# Altium footprint library ACTION_IC封装.PcbLib: 114 footprints (part 1 of 8)
Each footprint in its own frame and in the unit in brackets; x right, y up, seen from the top. Pads: shape width x height; smd on the part's side, far side on the other; paste and mask are expansions set on the pad; w line width, h text height; cw(c..) or ccw(c..) is an arc to the next point about the centre after c.
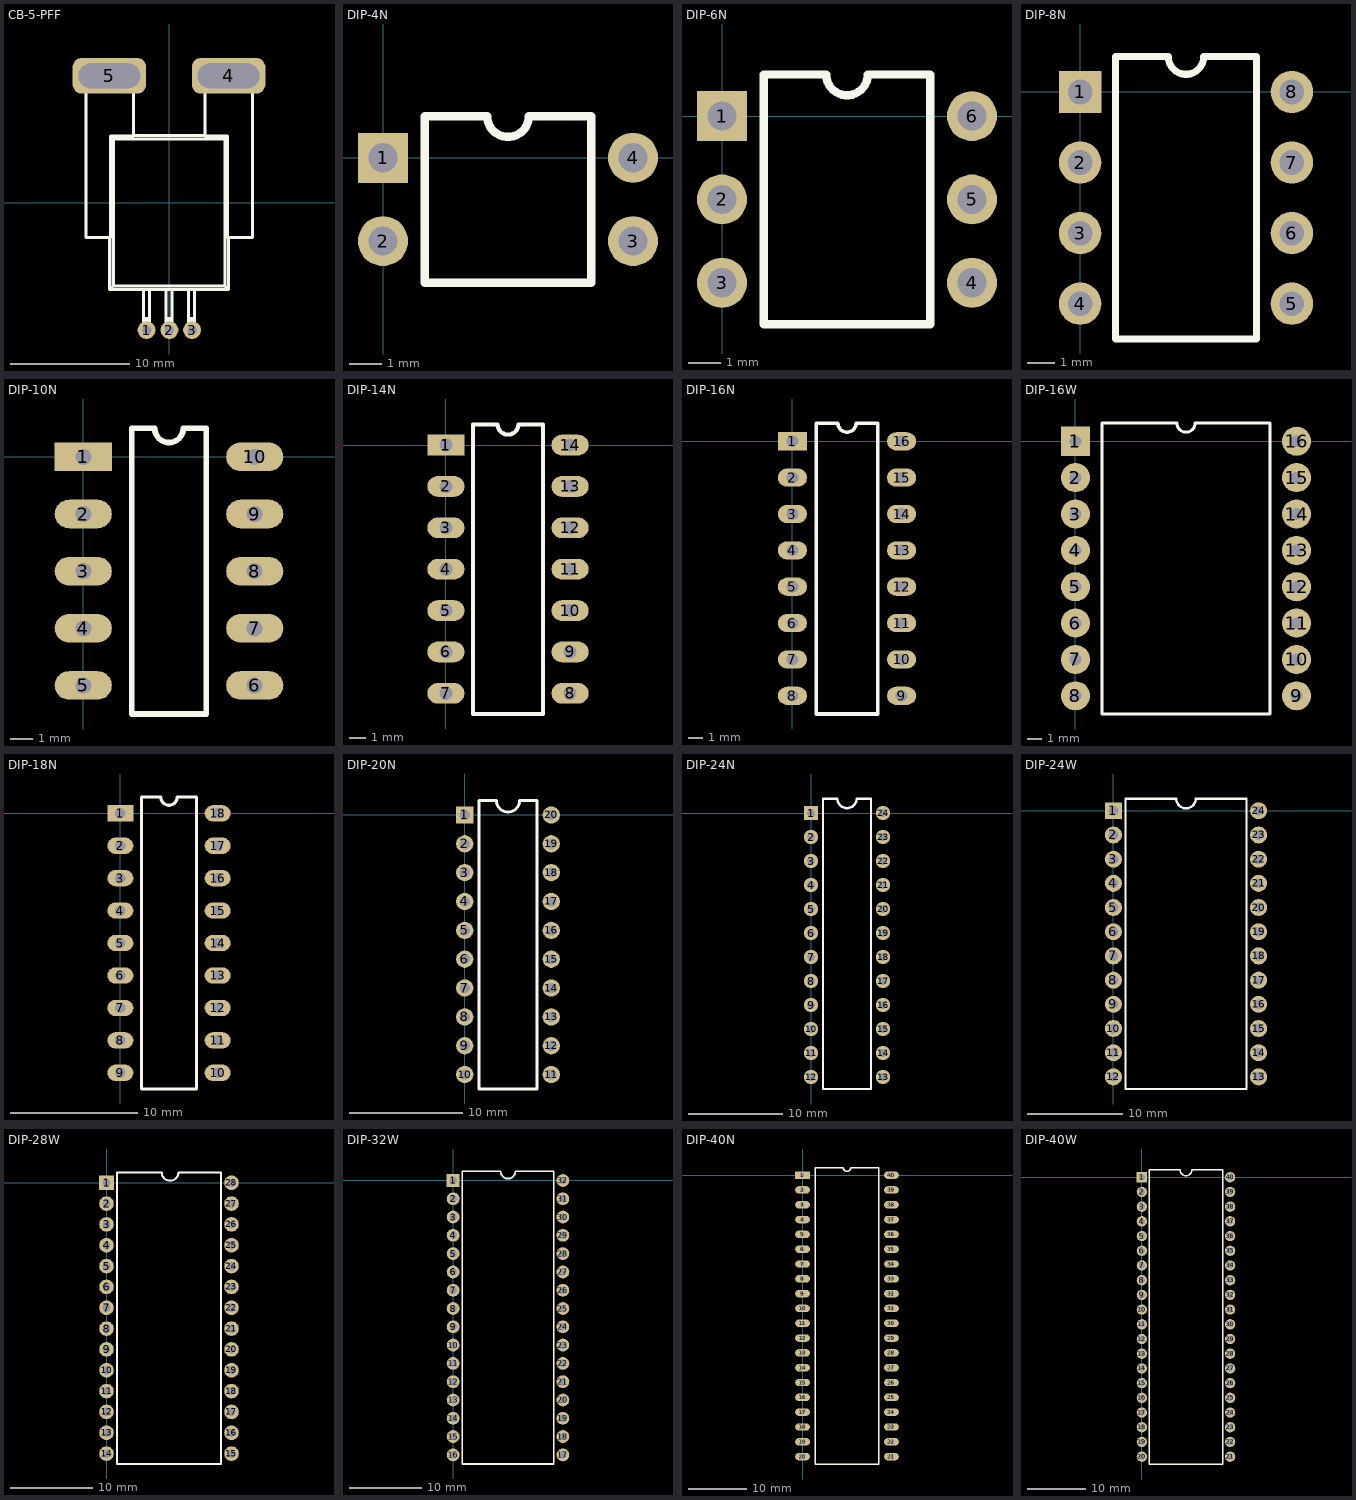
[diagram p0: the footprints below, top view; thin cyan lines are the x and y axes]

## CB-5-PFF [mm]
pads (5):
  round 1.5 hole 0.8: 1(-1.892,-10.706) 2(0.038,-10.706) 3(1.943,-10.706)
  rrect50% 6.2x3 hole 2.1 slot 5.2 at 0 deg: 4(5.016,10.706) 5(-5.016,10.706)
Top Overlay:
  lines w0.254: -4.989,-2.901 -4.989,-7.301 ; -2.989,5.699 3.011,5.699 ; -2.139,-10.552 -2.139,-9.982 ; -2.139,-10.431 -2.139,-9.743 ; -1.639,-10.552 -1.639,-9.982 ; -1.639,-10.431 -1.639,-9.743 ; -0.239,-10.552 -0.239,-9.982 ; -0.239,-10.431 -0.239,-9.743 ; 0.261,-10.552 0.261,-9.982 ; 0.261,-10.431 0.261,-9.743 ; 1.661,-10.552 1.661,-9.982 ; 1.661,-10.431 1.661,-9.743 ; 2.161,-10.552 2.161,-9.982 ; 2.161,-10.431 2.161,-9.743 ; 5.011,-2.901 5.011,-7.301 ; -6.989,9.475 -2.989,9.475 ; -6.989,9.475 -6.989,-2.901 -4.923,-2.901 -4.923,5.633 ; -6.989,9.475 -6.989,11.724 ; -6.989,11.724 -2.989,11.724 ; -6.989,11.724 -6.989,11.821 -2.989,11.821 -2.989,11.724 ; -4.989,-7.301 -2.139,-7.301 ; -4.989,-7.301 -4.682,-6.995 ; -4.923,5.633 -2.989,5.633 -2.989,9.475 ; -4.923,5.633 -4.682,5.392 ; -4.682,-6.995 4.705,-6.995 ; -4.682,-6.995 -4.682,5.392 ; -4.682,5.392 4.705,5.392 ; -2.989,9.475 -2.989,11.724 ; -2.139,-9.982 -1.639,-9.982 ; -2.139,-9.982 -1.639,-9.982 ; -2.139,-9.743 -1.639,-9.743 ; -2.139,-9.743 -2.139,-7.301 ; -2.139,-7.301 -1.639,-7.301 ; -1.639,-9.743 -1.639,-7.301 ; -1.639,-7.301 -0.239,-7.301 ; -0.239,-9.982 0.261,-9.982 ; -0.239,-9.982 0.261,-9.982 ; -0.239,-9.743 0.261,-9.743 ; -0.239,-9.743 -0.239,-7.301 ; -0.239,-7.301 0.261,-7.301 ; 0.261,-9.743 0.261,-7.301 ; 0.261,-7.301 1.661,-7.301 ; 1.661,-9.982 2.161,-9.982 ; 1.661,-9.982 2.161,-9.982 ; 1.661,-9.743 2.161,-9.743 ; 1.661,-9.743 1.661,-7.301 ; 1.661,-7.301 2.161,-7.301 ; 2.161,-9.743 2.161,-7.301 ; 2.161,-7.301 5.011,-7.301 ; 3.011,9.475 7.011,9.475 ; 3.011,9.475 3.011,5.633 4.946,5.633 ; 3.011,9.475 3.011,11.724 ; 3.011,11.724 7.011,11.724 ; 3.011,11.724 3.011,11.821 7.011,11.821 7.011,11.724 ; 4.705,-6.995 4.705,5.392 ; 4.705,-6.995 5.011,-7.301 ; 4.705,5.392 4.946,5.633 ; 4.946,5.633 4.946,-2.901 7.011,-2.901 7.011,9.475 ; 7.011,9.475 7.011,11.724
3D body "SW3dPS-ACS754SCB-200-PFF.STEP": height 7.31, standoff -3.2, extent -6.951,-11.24 7.049,11.582

## DIP-4N [mil]
pads (4):
  rect 60x60 hole 35: 1(0,0)
  round 60 hole 35: 2(0,-100) 3(300,-100) 4(300,0)
Top Overlay:
  lines w10: 50,-150 250,-150 250,50 175,50 cw(c150,50) 125,50 50,50 50,-150
3D body "DIP4.STEP": height 169.69, standoff -129.13, extent -13.48,-160.05 301.48,58.06

## DIP-6N [mil]
pads (6):
  rect 60x60 hole 35: 1(0,0)
  round 60 hole 35: 2(0,-100) 3(0,-200) 4(300,-200) 5(300,-100) 6(300,0)
Top Overlay:
  lines w10: 50,-250 50,50 125,50 ccw(c150,50) 175,50 250,50 250,-250 50,-250
3D body "DIP6.STEP": height 169.69, standoff -129.13, extent -12.48,-260.05 302.48,58.06

## DIP-8N [mil]
pads (8):
  rect 60x60 hole 35: 1(0,0)
  round 60 hole 35: 2(0,-100) 3(0,-200) 4(0,-300) 5(300,-300) 6(300,-200) 7(300,-100) 8(300,0)
Top Overlay:
  lines w10: 50,-350 250,-350 250,50 175,50 cw(c150,50) 125,50 50,50 50,-350
3D body "DIP8.STEP": height 177.17, standoff -137.8, extent -1.76,-364.6 303.77,60.6

## DIP-10N [mil]
pads (10):
  rect 100x50 hole 28: 1(0,0)
  oval 100x50 hole 28: 2(0,-100) 3(0,-200) 4(0,-300) 5(0,-400) 6(300,-400) 7(300,-300) 8(300,-200) 9(300,-100) 10(300,0)
Top Overlay:
  lines w10: 85,-450 85,50 125,50 ccw(c150,50) 175,50 215,50 215,-450 85,-450

## DIP-14N [mil]
pads (14):
  rect 90x50 hole 32: 1(0,0)
  oval 90x50 hole 32: 2(0,-100) 3(0,-200) 4(0,-300) 5(0,-400) 6(0,-500) 7(0,-600) 8(300,-600) 9(300,-500) 10(300,-400) 11(300,-300) 12(300,-200) 13(300,-100) 14(300,0)
Top Overlay:
  lines w10: 65,-650 65,50 125,50 ccw(c150,50) 175,50 235,50 235,-650 65,-650
3D body "DIP14.STEP": height 179.92, standoff -150, extent -5.93,-682.47 301.94,82.49

## DIP-16N [mil]
pads (16):
  rect 80x50 hole 32: 1(0,0)
  oval 80x50 hole 32: 2(0,-100) 3(0,-200) 4(0,-300) 5(0,-400) 6(0,-500) 7(0,-600) 8(0,-700) 9(300,-700) 10(300,-600) 11(300,-500) 12(300,-400) 13(300,-300) 14(300,-200) 15(300,-100) 16(300,0)
Top Overlay:
  lines w10: 65,-750 235,-750 235,50 175,50 cw(c150,50) 125,50 65,50 65,-750
3D body "DIP16.STEP": height 179.92, standoff -150, extent -2.93,-734.47 304.94,30.49

## DIP-16W [mm]
pads (16):
  rect 2x2 hole 0.8: 1(0,0)
  round 2 hole 0.8: 2(0,-2.5) 3(0,-5) 4(0,-7.5) 5(0,-10) 6(0,-12.5) 7(0,-15) 8(0,-17.5) 9(15.2,-17.5) 10(15.2,-15) 11(15.2,-12.5) 12(15.2,-10) 13(15.2,-7.5) 14(15.2,-5) 15(15.2,-2.5) 16(15.2,0)
Top Overlay:
  lines w0.2: 1.835,-18.75 13.365,-18.75 13.365,1.25 8.225,1.25 cw(c7.6,1.25) 6.975,1.25 1.835,1.25 1.835,-18.75

## DIP-18N [mil]
pads (18):
  rect 80x50 hole 32: 1(0,0)
  oval 80x50 hole 32: 2(0,-100) 3(0,-200) 4(0,-300) 5(0,-400) 6(0,-500) 7(0,-600) 8(0,-700) 9(0,-800) 10(300,-800) 11(300,-700) 12(300,-600) 13(300,-500) 14(300,-400) 15(300,-300) 16(300,-200) 17(300,-100) 18(300,0)
Top Overlay:
  lines w10: 65,-850 65,50 125,50 ccw(c150,50) 175,50 235,50 235,-850 65,-850
3D body "DIP18.STEP": height 179.92, standoff -150, extent -10.94,-855.47 296.93,59.49

## DIP-20N [mil]
pads (20):
  rect 60x60 hole 35: 1(0,0)
  round 60 hole 35: 2(0,-100) 3(0,-200) 4(0,-300) 5(0,-400) 6(0,-500) 7(0,-600) 8(0,-700) 9(0,-800) 10(0,-900) 11(300,-900) 12(300,-800) 13(300,-700) 14(300,-600) 15(300,-500) 16(300,-400) 17(300,-300) 18(300,-200) 19(300,-100) 20(300,0)
Top Overlay:
  lines w10: 50,-950 50,50 110,50 ccw(c150,50) 190,50 250,50 250,-950 50,-950
3D body "DIP-20pin.STEP": height 165, standoff -80, extent -10.99,-957.49 299,57.51

## DIP-24N [mil]
pads (24):
  rect 60x60 hole 35: 1(0,0)
  round 60 hole 35: 2(0,-100) 3(0,-200) 4(0,-300) 5(0,-400) 6(0,-500) 7(0,-600) 8(0,-700) 9(0,-800) 10(0,-900) 11(0,-1000) 12(0,-1100) 13(300,-1100) 14(300,-1000) 15(300,-900) 16(300,-800) 17(300,-700) 18(300,-600) 19(300,-500) 20(300,-400) 21(300,-300) 22(300,-200) 23(300,-100) 24(300,0)
Top Overlay:
  lines w10: 50,-1150 50,60 110,60 ccw(c150,60) 190,60 250,60 250,-1150 50,-1150
3D body "DIP24.STEP": height 179.92, standoff -150, extent -5.94,-1183.47 301.94,81.49

## DIP-24W [mil]
pads (24):
  rect 70x70 hole 40: 1(0,0)
  round 70 hole 40: 2(0,-100) 3(0,-200) 4(0,-300) 5(0,-400) 6(0,-500) 7(0,-600) 8(0,-700) 9(0,-800) 10(0,-900) 11(0,-1000) 12(0,-1100) 13(600,-1100) 14(600,-1000) 15(600,-900) 16(600,-800) 17(600,-700) 18(600,-600) 19(600,-500) 20(600,-400) 21(600,-300) 22(600,-200) 23(600,-100) 24(600,0)
Top Overlay:
  lines w10: 50,-1150 550,-1150 550,50 340,50 cw(c300,50) 260,50 50,50 50,-1150
3D body "DIP24-W.STEP": height 200.39, standoff -150, extent 2.07,-1185.03 609.94,85.05

## DIP-28W [mil]
pads (28):
  rect 70x70 hole 40: 1(0,0)
  round 70 hole 40: 2(0,-100) 3(0,-200) 4(0,-300) 5(0,-400) 6(0,-500) 7(0,-600) 8(0,-700) 9(0,-800) 10(0,-900) 11(0,-1000) 12(0,-1100) 13(0,-1200) 14(0,-1300) 15(600,-1300) 16(600,-1200) 17(600,-1100) 18(600,-1000) 19(600,-900) 20(600,-800) 21(600,-700) 22(600,-600) 23(600,-500) 24(600,-400) 25(600,-300) 26(600,-200) 27(600,-100) 28(600,0)
Top Overlay:
  lines w10: 50,-1350 50,50 265,50 ccw(c305,50) 345,50 550,50 550,-1350 50,-1350
3D body "DIP28-W.STEP": height 200.39, standoff -150, extent -3.94,-1385.04 603.94,85.04

## DIP-32W [mil]
pads (32):
  rect 70x70 hole 40: 1(0,0)
  round 70 hole 40: 2(0,-100) 3(0,-200) 4(0,-300) 5(0,-400) 6(0,-500) 7(0,-600) 8(0,-700) 9(0,-800) 10(0,-900) 11(0,-1000) 12(0,-1100) 13(0,-1200) 14(0,-1300) 15(0,-1400) 16(0,-1500) 17(600,-1500) 18(600,-1400) 19(600,-1300) 20(600,-1200) 21(600,-1100) 22(600,-1000) 23(600,-900) 24(600,-800) 25(600,-700) 26(600,-600) 27(600,-500) 28(600,-400) 29(600,-300) 30(600,-200) 31(600,-100) 32(600,0)
Top Overlay:
  lines w10: 50,-1550 50,50 260,50 ccw(c300,50) 340,50 550,50 550,-1550 50,-1550
3D body "SW3DPS-DIP 32 IC WITH 0_380IN WINDOW-DEFAULT.STEP": height 227.95, standoff -129.92, extent -1.91,-1571.56 599.9,83.56

## DIP-40N [mm]
pads (40):
  rect 2.54x1.27 hole 0.635: 1(0,0)
  oval 2.54x1.27 hole 0.635: 2(0,-2.54) 3(0,-5.08) 4(0,-7.62) 5(0,-10.16) 6(0,-12.7) 7(0,-15.24) 8(0,-17.78) 9(0,-20.32) 10(0,-22.86) 11(0,-25.4) 12(0,-27.94) 13(0,-30.48) 14(0,-33.02) 15(0,-35.56) 16(0,-38.1) 17(0,-40.64) 18(0,-43.18) 19(0,-45.72) 20(0,-48.26) 21(15.24,-48.26) 22(15.24,-45.72) 23(15.24,-43.18) 24(15.24,-40.64) 25(15.24,-38.1) 26(15.24,-35.56) 27(15.24,-33.02) 28(15.24,-30.48) 29(15.24,-27.94) 30(15.24,-25.4) 31(15.24,-22.86) 32(15.24,-20.32) 33(15.24,-17.78) 34(15.24,-15.24) 35(15.24,-12.7) 36(15.24,-10.16) 37(15.24,-7.62) 38(15.24,-5.08) 39(15.24,-2.54) 40(15.24,0)
Top Overlay:
  lines w0.254: 2.159,-49.53 2.159,1.27 6.985,1.27 ccw(c7.62,1.27) 8.255,1.27 13.081,1.27 13.081,-49.53 2.159,-49.53
3D body "DIP40.STEP": height 5.7, standoff -2.58, extent -0.099,-50.33 15.391,2.12

## DIP-40W [mil]
pads (40):
  rect 70x70 hole 40: 1(0,0)
  round 70 hole 40: 2(0,-100) 3(0,-200) 4(0,-300) 5(0,-400) 6(0,-500) 7(0,-600) 8(0,-700) 9(0,-800) 10(0,-900) 11(0,-1000) 12(0,-1100) 13(0,-1200) 14(0,-1300) 15(0,-1400) 16(0,-1500) 17(0,-1600) 18(0,-1700) 19(0,-1800) 20(0,-1900) 21(600,-1900) 22(600,-1800) 23(600,-1700) 24(600,-1600) 25(600,-1500) 26(600,-1400) 27(600,-1300) 28(600,-1200) 29(600,-1100) 30(600,-1000) 31(600,-900) 32(600,-800) 33(600,-700) 34(600,-600) 35(600,-500) 36(600,-400) 37(600,-300) 38(600,-200) 39(600,-100) 40(600,0)
Top Overlay:
  lines w10: 50,-1950 50,50 260,50 ccw(c300,50) 340,50 550,50 550,-1950 50,-1950
3D body "DIP-40.STEP": height 112.6, standoff -176.97, extent -1.7,-1973.74 609.72,83.74